# Altium footprint library DA, DD IC.PcbLib: 64 footprints (part 3 of 4)
Each footprint in its own frame and in the unit in brackets; x right, y up, seen from the top. Pads: shape width x height; smd on the part's side, far side on the other; paste and mask are expansions set on the pad; w line width, h text height; cw(c..) or ccw(c..) is an arc to the next point about the centre after c.
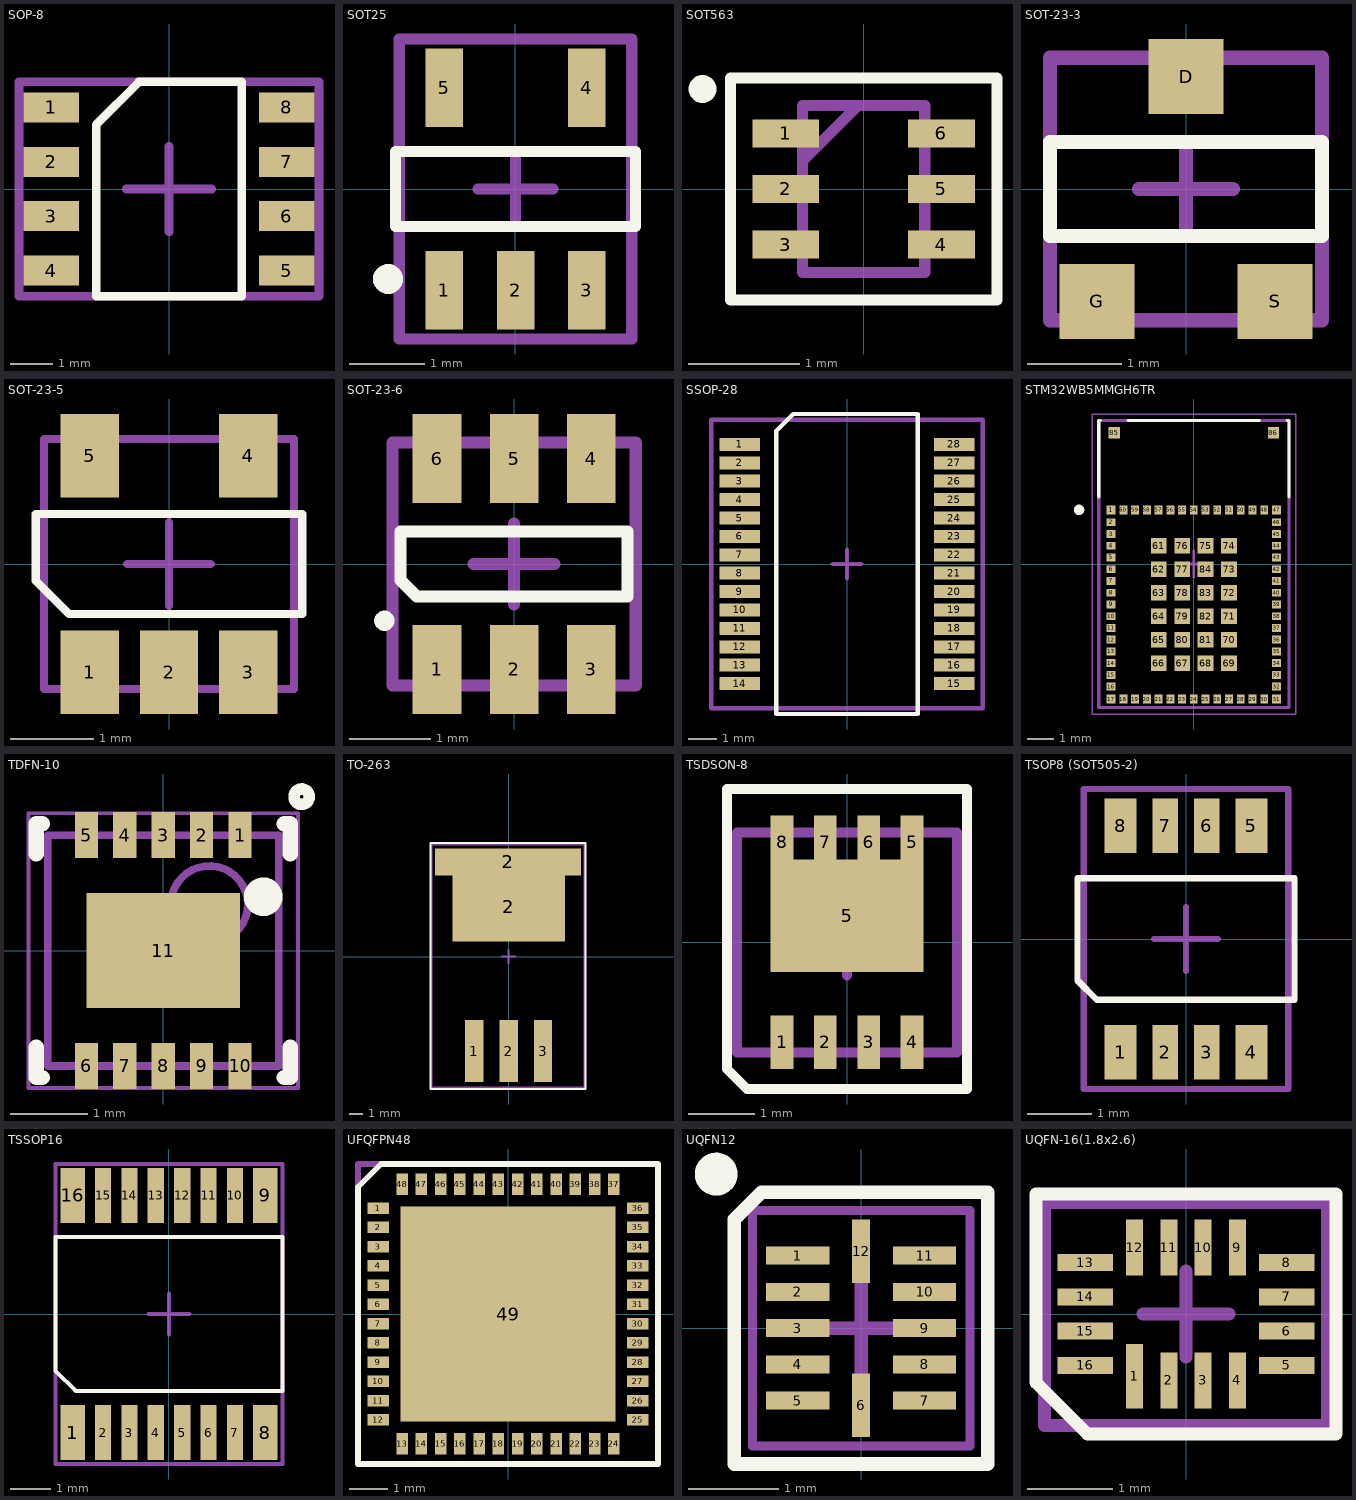
[diagram p2: the footprints below, top view; thin cyan lines are the x and y axes]

## SOP-8 [mm]
pads (8):
  rect 1.3x0.7 smd: 1(-2.75,1.905) 2(-2.75,0.635) 3(-2.75,-0.635) 4(-2.75,-1.905) 5(2.75,-1.905) 6(2.75,-0.635) 7(2.75,0.635) 8(2.75,1.905)
Top Overlay:
  lines w0.2: -1.7,-2.5 -1.7,1.5 -0.7,2.5 1.7,2.5 1.7,-2.5 -1.7,-2.5
Mechanical 15:
  lines w0.2: -1,0 1,0 ; 0,-1 0,1 ; -3.5,-2.5 -3.5,2.5 3.5,2.5 3.5,-2.5 -3.5,-2.5
3D body "User Library-so-8.step": height 1.88, standoff -0.03, extent -3.169,-2.5 3.169,2.504

## SOT25 [mm]
pads (5):
  rect 0.5x1.05 smd: 1(-0.95,-1.35) 2(0,-1.35) 3(0.95,-1.35) 4(0.95,1.35) 5(-0.95,1.35)
Top Overlay:
  circle w0.2: c-1.7,-1.2 r0.1
  lines w0.15: -1.6,-0.5 -1.6,0.5 1.6,0.5 1.6,-0.5 -1.6,-0.5
Mechanical 13:
  lines w0.15: -0.5,0 0.5,0 ; 0,-0.5 0,0.5 ; -1.55,-2 -1.55,2 1.55,2 1.55,-2 -1.55,-2
3D body "User Library-SOT-25.step": height 1.2, standoff 0, extent -1.45,-1.4 1.45,1.4

## SOT563 [mm]
pads (6):
  rect 0.6x0.25 smd: 1(-0.7,0.5) 2(-0.7,0) 3(-0.7,-0.5) 4(0.7,-0.5) 5(0.7,0) 6(0.7,0.5)
Top Overlay:
  circle w0.15: c-1.45,0.9 r0.05
  lines w0.1: -1.2,-1 -1.2,1 1.2,1 1.2,-1 -1.2,-1
Mechanical 15:
  lines w0.1: -0.55,0.25 -0.05,0.75 ; -0.55,-0.75 -0.55,0.75 0.55,0.75 0.55,-0.75 -0.55,-0.75
3D body "User Library-SOT-563_TI.STEP": height 0.59, standoff 0, extent -0.813,-0.8 0.813,0.8

## SOT-23-3 [mm]
height 1.25
pads (3):
  rect 0.8x0.8 smd: D(0,1.2) G(-0.95,-1.2) S(0.95,-1.2)
Top Overlay:
  lines w0.15: -1.45,-0.5 -1.45,0.5 1.45,0.5 1.45,-0.5 -1.45,-0.5
Mechanical 13:
  lines w0.15: -0.5,0 0.5,0 ; 0,-0.5 0,0.5 ; -1.45,-1.4 -1.45,1.4 1.45,1.4 1.45,-1.4 -1.45,-1.4
3D body "CircuitWorks-SOT-23.step": height 1.1, standoff 0, extent -1.5,-1.25 1.5,1.25

## SOT-23-5 [mm] "SOT-23-5"
height 1.25
pads (5):
  rect 0.7x1 smd: 1(-0.95,-1.3) 2(0,-1.3) 3(0.95,-1.3) 4(0.95,1.3) 5(-0.95,1.3)
Top Overlay:
  lines w0.1: -1.6,-0.2 -1.6,0.6 1.6,0.6 1.6,-0.6 -1.2,-0.6 -1.6,-0.2
Mechanical 15:
  lines w0.1: -0.5,0 0.5,0 ; 0,-0.5 0,0.5 ; -1.5,-1.5 1.5,-1.5 1.5,1.5 -1.5,1.5 -1.5,-1.5
3D body "User Library-SOT23-5-2.step": height 1.45, standoff 0, extent -1.45,-1.4 1.45,1.4

## SOT-23-6 [mm]
pads (6):
  rect 0.6x1.1 smd: 1(-0.95,-1.3) 2(0,-1.3) 3(0.95,-1.3) 4(0.95,1.3) 5(0,1.3) 6(-0.95,1.3)
Top Overlay:
  circle w0.15: c-1.6,-0.7 r0.05
  lines w0.15: -1.4,-0.2 -1.2,-0.4 1.4,-0.4 1.4,0.4 -1.4,0.4 -1.4,-0.2
Mechanical 13:
  lines w0.15: -0.5,0 0.5,0 ; 0,-0.5 0,0.5 ; -1.5,-1.5 1.5,-1.5 1.5,1.5 -1.5,1.5 -1.5,-1.5
3D body "User Library-SOT23-6-2.step": height 1.45, standoff 0, extent -1.45,-1.4 1.45,1.4

## SSOP-28 [mm]
pads (28):
  rect 1.43x0.46 smd: 1(-3.795,4.225) 2(-3.795,3.575) 3(-3.795,2.925) 4(-3.795,2.275) 5(-3.795,1.625) 6(-3.795,0.975) 7(-3.795,0.325) 8(-3.795,-0.325) 9(-3.795,-0.975) 10(-3.795,-1.625) 11(-3.795,-2.275) 12(-3.795,-2.925) 13(-3.795,-3.575) 14(-3.795,-4.225) 15(3.795,-4.225) 16(3.795,-3.575) 17(3.795,-2.925) 18(3.795,-2.275) 19(3.795,-1.625) 20(3.795,-0.975) 21(3.795,-0.325) 22(3.795,0.325) 23(3.795,0.975) 24(3.795,1.625) 25(3.795,2.275) 26(3.795,2.925) 27(3.795,3.575) 28(3.795,4.225)
Top Overlay:
  lines w0.15: -2.5,-5.3 -2.5,4.7 -1.9,5.3 2.5,5.3 2.5,-5.3 -2.5,-5.3
Mechanical 13:
  lines w0.15: -0.5,0 0.5,0 ; 0,-0.5 0,0.5 ; -4.8,-5.1 -4.8,5.1 4.8,5.1 4.8,-5.1 -4.8,-5.1
3D body "User Library-ssop28_model.STEP": height 2.01, standoff 0.01, extent -3.909,-5.098 3.891,5.102

## STM32WB5MMGH6TR [mm]
pads (86):
  rect 0.35x0.35 smd mask+0.05: 1(-3.175,2.075) 17(-3.175,-5.175) 31(3.175,-5.175) 47(3.175,2.075)
  rect 0.35x0.3 smd mask+0.05: 2(-3.175,1.6) 3(-3.175,1.15) 4(-3.175,0.7) 5(-3.175,0.25) 6(-3.175,-0.2) 7(-3.175,-0.65) 8(-3.175,-1.1) 9(-3.175,-1.55) 10(-3.175,-2) 11(-3.175,-2.45) 12(-3.175,-2.9) 13(-3.175,-3.35) 14(-3.175,-3.8) 15(-3.175,-4.25) 16(-3.175,-4.7) 32(3.175,-4.7) 33(3.175,-4.25) 34(3.175,-3.8) 35(3.175,-3.35) 36(3.175,-2.9) 37(3.175,-2.45) 38(3.175,-2) 39(3.175,-1.55) 40(3.175,-1.1) 41(3.175,-0.65) 42(3.175,-0.2) 43(3.175,0.25) 44(3.175,0.7) 45(3.175,1.15) 46(3.175,1.6)
  rect 0.3x0.35 smd mask+0.05: 18(-2.7,-5.175) 19(-2.25,-5.175) 20(-1.8,-5.175) 21(-1.35,-5.175) 22(-0.9,-5.175) 23(-0.45,-5.175) 24(0,-5.175) 25(0.45,-5.175) 26(0.9,-5.175) 27(1.35,-5.175) 28(1.8,-5.175) 29(2.25,-5.175) 30(2.7,-5.175) 48(2.7,2.075) 49(2.25,2.075) 50(1.8,2.075) 51(1.35,2.075) 52(0.9,2.075) 53(0.45,2.075) 54(0,2.075) 55(-0.45,2.075) 56(-0.9,2.075) 57(-1.35,2.075) 58(-1.8,2.075) 59(-2.25,2.075) 60(-2.7,2.075)
  rect 0.6x0.6 smd mask+0.05: 61(-1.35,0.7) 62(-1.35,-0.2) 63(-1.35,-1.1) 64(-1.35,-2) 65(-1.35,-2.9) 66(-1.35,-3.8) 67(-0.45,-3.8) 68(0.45,-3.8) 69(1.35,-3.8) 70(1.35,-2.9) 71(1.35,-2) 72(1.35,-1.1) 73(1.35,-0.2) 74(1.35,0.7) 75(0.45,0.7) 76(-0.45,0.7) 77(-0.45,-0.2) 78(-0.45,-1.1) 79(-0.45,-2) 80(-0.45,-2.9) 81(0.45,-2.9) 82(0.45,-2) 83(0.45,-1.1) 84(0.45,-0.2)
  rect 0.43x0.43 smd mask+0.05: 85(-3.05,5.035) 86(3.05,5.035)
Top Overlay:
  circle w0.2: c-4.4,2.075 r0.1
  circle w0.2: c-4.4,2.075 r0.1
  lines w0.127: -3.65,2.57 -3.65,5.5 -3.585,5.5 ; -2.515,5.5 2.515,5.5 ; 3.585,5.5 3.65,5.5 3.65,2.57
Mechanical 15:
  lines w0.05: -3.9,-5.75 3.9,-5.75 3.9,5.75 -3.9,5.75 -3.9,-5.75
  lines w0.1: -0.5,0 0.5,0 ; 0,-0.5 0,0.5
  lines w0.127: -3.65,-5.5 3.65,-5.5 3.65,5.5 -3.65,5.5 -3.65,-5.5
3D body "step_temp.STEP": height 1.43, standoff -0.01, extent -3.65,-5.5 3.65,5.5

## TDFN-10 [mm]
height 0.8
pads (11):
  rect 0.3x0.6 smd mask+0.05: 1(1,1.5) 2(0.5,1.5) 3(0,1.5) 4(-0.5,1.5) 5(-1,1.5) 6(-1,-1.5) 7(-0.5,-1.5) 8(0,-1.5) 9(0.5,-1.5) 10(1,-1.5)
  rect 2x1.5 smd mask+0.05: 11(0,0)
Top Overlay:
  circle w0.3: c1.3,0.7 r0.1
  circle w0.15: c1.8,2 r0.1
  lines w0.2: -1.65,-1.255 -1.65,-1.65 -1.575,-1.65 ; -1.65,1.255 -1.65,1.65 -1.575,1.65 ; 1.575,-1.65 1.65,-1.65 1.65,-1.255 ; 1.575,1.65 1.65,1.65 1.65,1.255
Mechanical 13:
  circle w0.1: c0.6,0.6 r0.5
  lines w0.1: -1.5,-1.5 -1.5,1.5 1.5,1.5 1.5,-1.5 -1.5,-1.5
Mechanical 15:
  lines w0.05: -1.75,-1.785 -1.75,1.785 1.75,1.785 1.75,-1.785 -1.75,-1.785
  lines w0.1: -0.5,0 0.5,0 ; 0,-0.5 0,0.5
3D body "PSON50P300X80_HS-11N.step": height 0.8, standoff 0, extent -1.5,-1.501 1.5,1.501

## TO-263 [mm]
pads (5):
  rect 1.35x4.6 smd: 1(-2.54,-7) 2(0,-7) 3(2.54,-7)
  rect 10.8x2 smd: 2(-0.04,7)
  rect 8.33x5.08 smd: 2(0,3.67)
Top Overlay:
  lines w0.15: -5.8,-9.8 -5.8,8.4 5.7,8.4 5.7,-9.8 -5.8,-9.8
Mechanical 15:
  lines w0.15: -0.5,0 0.5,0 ; 0,-0.5 0,0.5 ; -5.7,-9.7 -5.7,8.3 5.6,8.3 5.6,-9.7 -5.7,-9.7
3D body "User Library-TO263-3.STEP": height 4.78, standoff -0.02, extent -5.1,-8.185 4.9,7.485

## TSDSON-8 [mm]
pads (9):
  rect 0.34x0.8 smd: 1(-0.975,-1.5) 2(-0.325,-1.5) 3(0.325,-1.5) 4(0.975,-1.5) 5(0.975,1.5) 6(0.325,1.5) 7(-0.325,1.5) 8(-0.975,1.5)
  rect 2.29x1.69 smd: 5(0,0.4)
Top Overlay:
  lines w0.15: -1.8,-1.9 -1.8,2.3 1.8,2.3 1.8,-2.2 -1.5,-2.2 -1.8,-1.9
Mechanical 13:
  lines w0.15: -0.5,0 0.5,0 ; 0,-0.5 0,0.5 ; -1.65,-1.65 1.65,-1.65 1.65,1.65 -1.65,1.65 -1.65,-1.65
3D body "User Library-PG-TSDSON-8-1.STEP": height -0.4, standoff -1.51, extent -1.7,-1.7 1.7,1.7

## TSOP8 (SOT505-2) [mm]
pads (8):
  rect 0.5x0.85 smd mask+0.05: 1(-1.025,-1.775) 4(1.025,-1.775) 5(1.025,1.775) 8(-1.025,1.775)
  rect 0.4x0.85 smd mask+0.05: 2(-0.325,-1.775) 3(0.325,-1.775) 6(0.325,1.775) 7(-0.325,1.775)
Top Overlay:
  lines w0.1: -1.7,-0.65 -1.4,-0.95 1.7,-0.95 1.7,0.95 -1.7,0.95 -1.7,-0.65
Mechanical 15:
  lines w0.1: -0.5,0 0.5,0 ; 0,-0.5 0,0.5 ; -1.6,-2.35 -1.6,2.35 1.6,2.35 1.6,-2.35 -1.6,-2.35
3D body "User Library-TSSOP8-1.step": height 1.1, standoff 0, extent -1.55,-2.05 1.55,2.05

## TSSOP16 [mm]
pads (16):
  rect 0.6x1.35 smd mask+0.05: 1(-2.375,-2.925) 8(2.375,-2.925) 9(2.375,2.925) 16(-2.375,2.925)
  rect 0.4x1.35 smd mask+0.05: 2(-1.625,-2.925) 3(-0.975,-2.925) 4(-0.325,-2.925) 5(0.325,-2.925) 6(0.975,-2.925) 7(1.625,-2.925) 10(1.625,2.925) 11(0.975,2.925) 12(0.325,2.925) 13(-0.325,2.925) 14(-0.975,2.925) 15(-1.625,2.925)
Top Overlay:
  lines w0.1: -2.8,-1.4 -2.3,-1.9 2.8,-1.9 2.8,1.9 -2.8,1.9 -2.8,-1.4
Mechanical 15:
  lines w0.1: -0.5,0 0.5,0 ; 0,-0.5 0,0.5 ; -2.8,-3.7 2.8,-3.7 2.8,3.7 -2.8,3.7 -2.8,-3.7
3D body "User Library-TSSOP-16-2.STEP": height 1.2, standoff 0, extent -2.5,-3.2 2.5,3.2

## UFQFPN48 [mm]
pads (49):
  rect 0.55x0.3 smd mask+0.07: 1(-3.375,2.75) 2(-3.375,2.25) 3(-3.375,1.75) 4(-3.375,1.25) 5(-3.375,0.75) 6(-3.375,0.25) 7(-3.375,-0.25) 8(-3.375,-0.75) 9(-3.375,-1.25) 10(-3.375,-1.75) 11(-3.375,-2.25) 12(-3.375,-2.75) 25(3.375,-2.75) 26(3.375,-2.25) 27(3.375,-1.75) 28(3.375,-1.25) 29(3.375,-0.75) 30(3.375,-0.25) 31(3.375,0.25) 32(3.375,0.75) 33(3.375,1.25) 34(3.375,1.75) 35(3.375,2.25) 36(3.375,2.75)
  rect 0.3x0.55 smd mask+0.07: 13(-2.75,-3.375) 14(-2.25,-3.375) 15(-1.75,-3.375) 16(-1.25,-3.375) 17(-0.75,-3.375) 18(-0.25,-3.375) 19(0.25,-3.375) 20(0.75,-3.375) 21(1.25,-3.375) 22(1.75,-3.375) 23(2.25,-3.375) 24(2.75,-3.375) 37(2.75,3.375) 38(2.25,3.375) 39(1.75,3.375) 40(1.25,3.375) 41(0.75,3.375) 42(0.25,3.375) 43(-0.25,3.375) 44(-0.75,3.375) 45(-1.25,3.375) 46(-1.75,3.375) 47(-2.25,3.375) 48(-2.75,3.375)
  rect 5.6x5.6 smd mask+0.07: 49(0,0)
Top Overlay:
  lines w0.15: -3.9,-3.9 3.9,-3.9 3.9,3.9 -3.3,3.9 -3.9,3.3 -3.9,-3.9
Mechanical 15:
  lines w0.15: -0.5,0 0.5,0 ; 0,-0.5 0,0.5 ; -3.9,-3.9 -3.9,3.9 3.9,3.9 3.9,-3.9 -3.9,-3.9
3D body "User Library-UFQFPN48.step": height 0.55, standoff 0, extent -3.5,-3.5 3.5,3.5

## UQFN12 [mm]
pads (12):
  rect 0.7x0.2 smd: 1(-0.7,0.8) 2(-0.7,0.4) 3(-0.7,0) 4(-0.7,-0.4) 5(-0.7,-0.8) 7(0.7,-0.8) 8(0.7,-0.4) 9(0.7,0) 10(0.7,0.4) 11(0.7,0.8)
  rect 0.2x0.7 smd: 6(0,-0.85) 12(0,0.85)
Top Overlay:
  circle w0.25: c-1.6,1.7 r0.112
  lines w0.15: -1.4,-1.5 1.4,-1.5 1.4,1.5 -1.1,1.5 -1.4,1.2 -1.4,-1.5
Mechanical 13:
  lines w0.1: -1.2,-1.3 -1.2,1.3 1.2,1.3 1.2,-1.3 -1.2,-1.3
  lines w0.15: -0.5,0 0.5,0 ; 0,-0.5 0,0.5
3D body "TXB0104RUTR--3DModel-STEP-56544.STEP": height 0.55, standoff 0, extent -0.85,-1 0.85,1

## UQFN-16(1.8x2.6) [mm]
pads (16):
  rect 0.2x0.75 smd mask+0.05: 1(-0.6,-0.725)
  rect 0.2x0.65 smd mask+0.05: 2(-0.2,-0.775) 3(0.2,-0.775) 4(0.6,-0.775) 9(0.6,0.775) 10(0.2,0.775) 11(-0.2,0.775) 12(-0.6,0.775)
  rect 0.65x0.2 smd mask+0.05: 5(1.175,-0.6) 6(1.175,-0.2) 7(1.175,0.2) 8(1.175,0.6) 13(-1.175,0.6) 14(-1.175,0.2) 15(-1.175,-0.2) 16(-1.175,-0.6)
Top Overlay:
  lines w0.15: -1.75,-0.8 -1.75,1.4 1.75,1.4 1.75,-1.4 -1.15,-1.4 -1.75,-0.8
Mechanical 15:
  lines w0.15: -0.5,0 0.5,0 ; 0,-0.5 0,0.5 ; -1.65,-1.3 1.65,-1.3 1.65,1.3 -1.65,1.3 -1.65,-1.3
3D body "User Library-UQFN-16-0_4(Case 2_6mmx1_8mm Height 0_55mm).STEP": height 0.56, standoff 0, extent -1.31,-0.91 1.31,0.91